# Altium schematic symbol library IC.SchLib: 555 symbols (part 9 of 15)
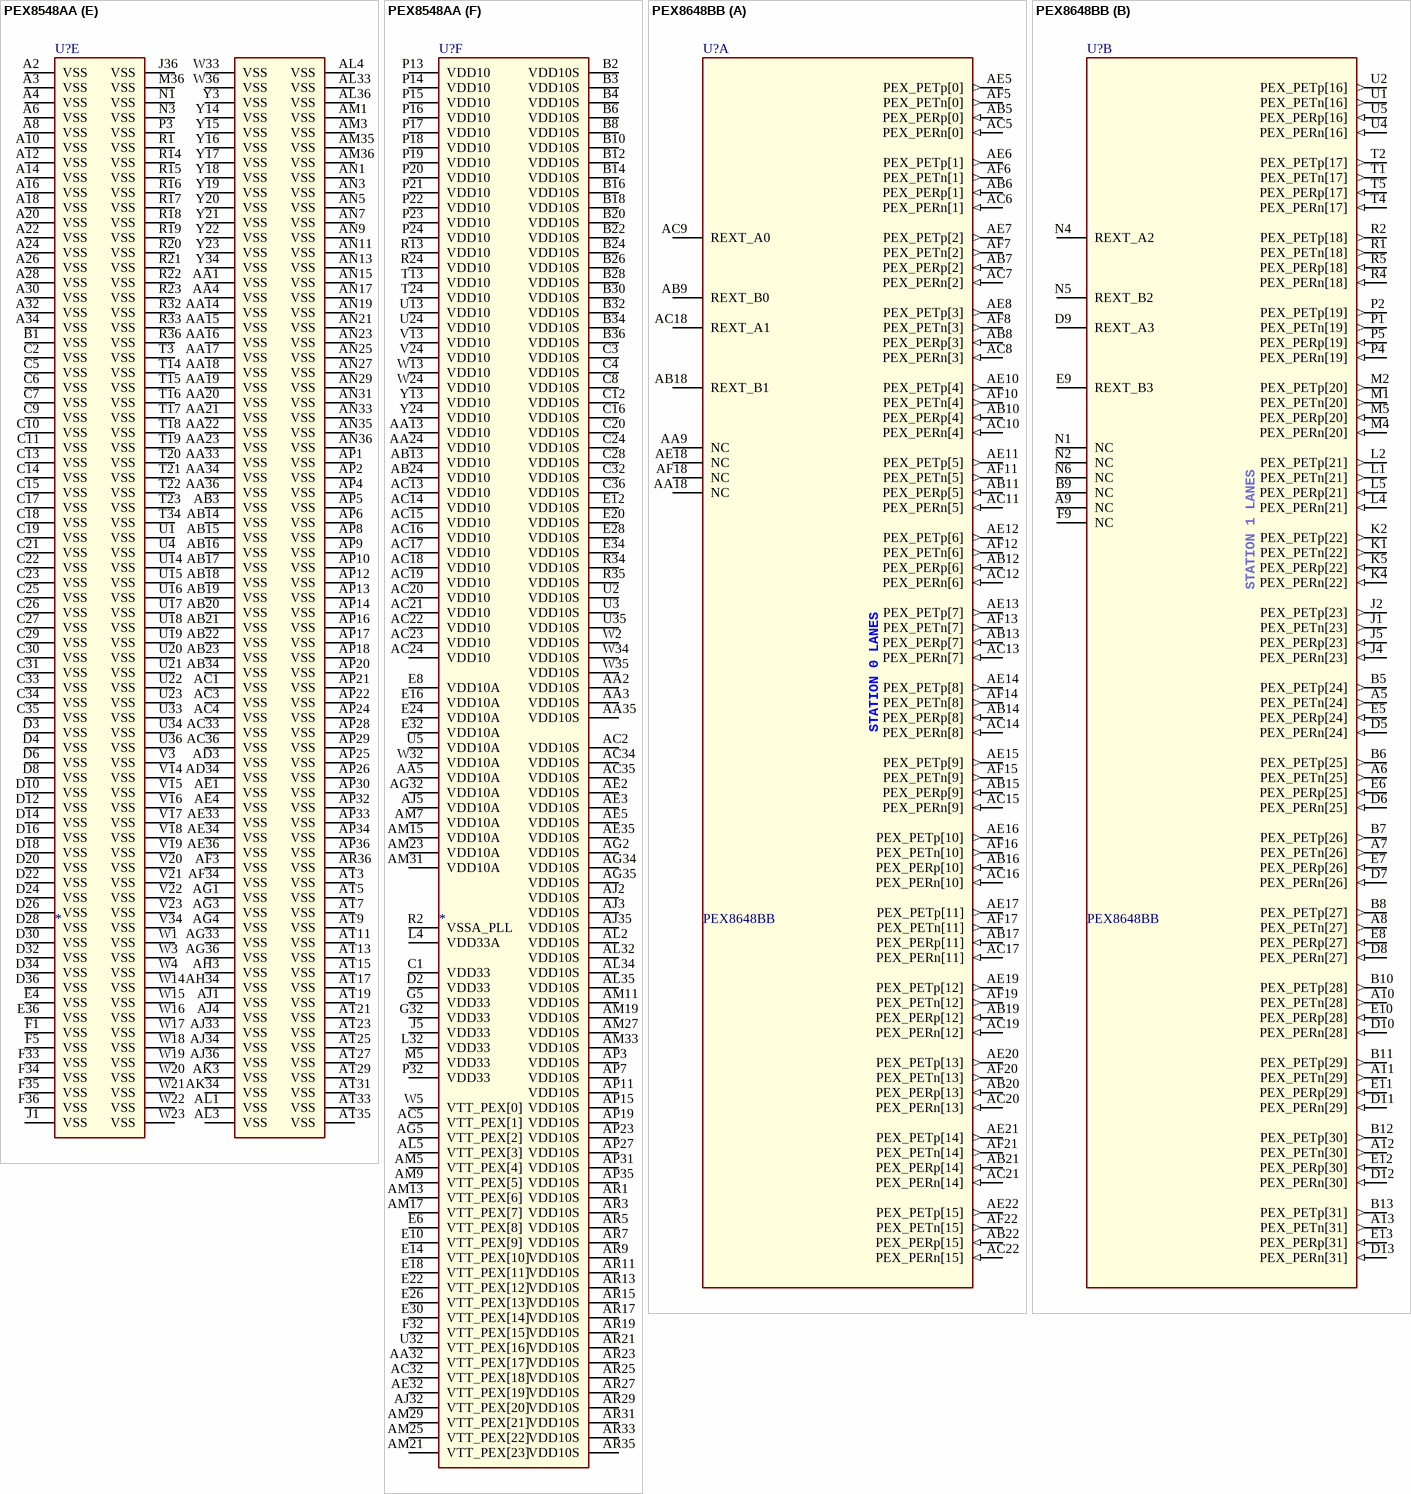
[diagram p78: symbols PEX8548AA to PEX8648BB]

## PEX8548AA
designator U?
Manufacturer: PLX Technology; Manufacturer No: PEX8548AA; Sort: 510; Tech: SMDR; Package: BGA736-H3; Price: 0
footprint BGA736-H3 (PBGA 736pin)
part A pins: AB1 PEX_PETn[2] (out), AB2 PEX_PETp[2] (out), AB4 PEX_PERp[2] (in), AB5 PEX_PERn[2] (in), AD1 PEX_PETn[3] (out), AD2 PEX_PETp[3] (out), AD4 PEX_PERp[3] (in), AD5 PEX_PERn[3] (in), AF1 PEX_PETn[4] (out), AF2 PEX_PETp[4] (out), AF4 PEX_PERp[4] (in), AF5 PEX_PERn[4] (in), AH1 PEX_PETn[5] (out), AH2 PEX_PETp[5] (out), AH4 PEX_PERp[5] (in), AH5 PEX_PERn[5] (in), AK1 PEX_PETn[6] (out), AK2 PEX_PETp[6] (out), AK4 PEX_PERp[6] (in), AK5 PEX_PERn[6] (in), AM2 PEX_PERn[7] (in), AM4 PEX_PERn[8] (in), AM6 PEX_PERn[9] (in), AM8 PEX_PERn[10] (in), AM10 PEX_PERn[11] (in), AM12 PEX_PERn[12] (in), AM14 PEX_PERn[13] (in), AM16 PEX_PERn[14] (in), AM18 PEX_PERn[15] (in), AN2 PEX_PERp[7] (in), AN4 PEX_PERp[8] (in), AN6 PEX_PERp[9] (in), AN8 PEX_PERp[10] (in), AN10 PEX_PERp[11] (in), AN12 PEX_PERp[12] (in), AN14 PEX_PERp[13] (in), AN16 PEX_PERp[14] (in), AN18 PEX_PERp[15] (in), AR2 PEX_PETp[7] (out), AR4 PEX_PETp[8] (out), AR6 PEX_PETp[9] (out), AR8 PEX_PETp[10] (out), AR10 PEX_PETp[11] (out), AR12 PEX_PETp[12] (out), AR14 PEX_PETp[13] (out), AR16 PEX_PETp[14] (out), AR18 PEX_PETp[15] (out), AT2 PEX_PETn[7] (out), AT4 PEX_PETn[8] (out), AT6 PEX_PETn[9] (out), AT8 PEX_PETn[10] (out), AT10 PEX_PETn[11] (out), AT12 PEX_PETn[12] (out), AT14 PEX_PETn[13] (out), AT16 PEX_PETn[14] (out), AT18 PEX_PETn[15] (out), D1 HP_BUTTON[1]# (in), H2 HP_MRL[1]# (in), H3 HP_ATNLED[1]# (out), J4 HP_PWRFLT[1]# (in), K1 HP_PRSNT[1]# (in), K2 HP_PWREN[1]# (out), K5 HP_PERST[1]# (out), M3 HP_CLKEN[1]# (out), M33 PEX_PORT_GOOD[2] (out), M35 PEX_PORT_GOOD[1] (out), N5 PEX_PORT_GOOD[0] (out), P4 HP_PWRLED[1]# (out), V1 PEX_PETn[0] (out), V2 PEX_PETp[0] (out), V4 PEX_PERp[0] (in), V5 PEX_PERn[0] (in), Y1 PEX_PETn[1] (out), Y2 PEX_PETp[1] (out), Y4 PEX_PERp[1] (in), Y5 PEX_PERn[1] (in)
part B pins: A5 PEX_PETn[16] (out), A7 PEX_PETn[17] (out), A9 PEX_PETn[18] (out), A11 PEX_PETn[19] (out), A13 PEX_PETn[20] (out), A15 PEX_PETn[21] (out), A17 PEX_PETn[22] (out), A19 PEX_PETn[23] (out), A21 PEX_PETn[24] (out), A23 PEX_PETn[25] (out), A25 PEX_PETn[26] (out), A27 PEX_PETn[27] (out), A29 PEX_PETn[28] (out), A31 PEX_PETn[29] (out), A33 PEX_PETn[30] (out), A35 PEX_PETn[31] (out), B5 PEX_PETp[16] (out), B7 PEX_PETp[17] (out), B9 PEX_PETp[18] (out), B11 PEX_PETp[19] (out), B13 PEX_PETp[20] (out), B15 PEX_PETp[21] (out), B17 PEX_PETp[22] (out), B19 PEX_PETp[23] (out), B21 PEX_PETp[24] (out), B23 PEX_PETp[25] (out), B25 PEX_PETp[26] (out), B27 PEX_PETp[27] (out), B29 PEX_PETp[28] (out), B31 PEX_PETp[29] (out), B33 PEX_PETp[30] (out), B35 PEX_PETp[31] (out), D5 PEX_PERp[16] (in), D7 PEX_PERp[17] (in), D9 PEX_PERp[18] (in), D11 PEX_PERp[19] (in), D13 PEX_PERp[20] (in), D15 PEX_PERp[21] (in), D17 PEX_PERp[22] (in), D19 PEX_PERp[23] (in), D21 PEX_PERp[24] (in), D23 PEX_PERp[25] (in), D25 PEX_PERp[26] (in), D27 PEX_PERp[27] (in), D29 PEX_PERp[28] (in), D31 PEX_PERp[29] (in), D33 PEX_PERp[30] (in), D35 PEX_PERp[31] (in), E1 HP_PWRLED[8]# (out), E5 PEX_PERn[16] (in), E7 PEX_PERn[17] (in), E9 PEX_PERn[18] (in), E11 PEX_PERn[19] (in), E13 PEX_PERn[20] (in), E15 PEX_PERn[21] (in), E17 PEX_PERn[22] (in), E19 PEX_PERn[23] (in), E21 PEX_PERn[24] (in), E23 PEX_PERn[25] (in), E25 PEX_PERn[26] (in), E27 PEX_PERn[27] (in), E29 PEX_PERn[28] (in), E31 PEX_PERn[29] (in), E33 PEX_PERn[30] (in), E35 PEX_PERn[31] (in), G3 HP_CLKEN[8]# (out), J2 HP_PRSNT[8]# (in), J3 HP_PERST[8]# (out), K4 HP_PWRLED[9]# (out), K32 PEX_PORT_GOOD[9] (out), L1 HP_CLKEN[9]# (out), L2 HP_ATNLED[8]# (out), L3 HP_PWRFLT[8]# (in), M1 HP_PWREN[9]# (out), M2 HP_PRSNT[9]# (in), M4 HP_PWREN[8]# (out), M32 PEX_PORT_GOOD[10] (out), N2 HP_ATNLED[9]# (out), N4 HP_MRL[8]# (in), P2 HP_MRL[9]# (in), P5 HP_BUTTON[8]# (in), R4 HP_PERST[9]# (out), R5 HP_PWRFLT[9]# (in), T4 HP_BUTTON[9]# (in), T5 PEX_PORT_GOOD[8] (out)
part C pins: AB32 PEX_PERn[35] (in), AB33 PEX_PERp[35] (in), AB35 PEX_PETp[35] (out), AB36 PEX_PETn[35] (out), AD32 PEX_PERn[36] (in), AD33 PEX_PERp[36] (in), AD35 PEX_PETp[36] (out), AD36 PEX_PETn[36] (out), AF32 PEX_PERn[37] (in), AF33 PEX_PERp[37] (in), AF35 PEX_PETp[37] (out), AF36 PEX_PETn[37] (out), AH32 PEX_PERn[38] (in), AH33 PEX_PERp[38] (in), AH35 PEX_PETp[38] (out), AH36 PEX_PETn[38] (out), AK32 PEX_PERn[39] (in), AK33 PEX_PERp[39] (in), AK35 PEX_PETp[39] (out), AK36 PEX_PETn[39] (out), AM20 PEX_PERn[47] (in), AM22 PEX_PERn[46] (in), AM24 PEX_PERn[45] (in), AM26 PEX_PERn[44] (in), AM28 PEX_PERn[43] (in), AM30 PEX_PERn[42] (in), AM32 PEX_PERn[41] (in), AM34 PEX_PERn[40] (in), AN20 PEX_PERp[47] (in), AN22 PEX_PERp[46] (in), AN24 PEX_PERp[45] (in), AN26 PEX_PERp[44] (in), AN28 PEX_PERp[43] (in), AN30 PEX_PERp[42] (in), AN32 PEX_PERp[41] (in), AN34 PEX_PERp[40] (in), AR20 PEX_PETp[47] (out), AR22 PEX_PETp[46] (out), AR24 PEX_PETp[45] (out), AR26 PEX_PETp[44] (out), AR28 PEX_PETp[43] (out), AR30 PEX_PETp[42] (out), AR32 PEX_PETp[41] (out), AR34 PEX_PETp[40] (out), AT20 PEX_PETn[47] (out), AT22 PEX_PETn[46] (out), AT24 PEX_PETn[45] (out), AT26 PEX_PETn[44] (out), AT28 PEX_PETn[43] (out), AT30 PEX_PETn[42] (out), AT32 PEX_PETn[41] (out), AT34 PEX_PETn[40] (out), L33 PEX_PORT_GOOD[14] (out), L35 PEX_PORT_GOOD[13] (out), L36 PEX_PORT_GOOD[12] (out), T32 PEX_PERn[32] (in), T33 PEX_PERp[32] (in), T35 PEX_PETp[32] (out), T36 PEX_PETn[32] (out), V32 PEX_PERn[33] (in), V33 PEX_PERp[33] (in), V35 PEX_PETp[33] (out), V36 PEX_PETn[33] (out), Y32 PEX_PERn[34] (in), Y33 PEX_PERp[34] (in), Y35 PEX_PETp[34] (out), Y36 PEX_PETn[34] (out)
part D pins: E2 THERMAL_DIODEn, E3 JTAG_TCK (in), F2 JTAG_TDI (in), F3 JTAG_TRST# (in), F4 JTAG_TMS (in), G1 STRAP_UPSTRM_PORTSEL[0] (in), G2 STRAP_UPSTRM_PORTSEL[2] (in), G4 JTAG_TDO (out), G33 STRAP_TESTMODE[0] (in), G34 STRAP_TESTMODE[1] (in), G35 NC, G36 I2C_INTA_ENABLE# (in), H1 STRAP_UPSTRM_PORTSEL[3] (in), H4 THERMAL_DIODEp, H5 PEX_PERST# (in), H32 STRAP_TESTMODE[3] (in), H33 STRAP_PROBE_MODE# (in), H34 STRAP_DEBUG_SEL[1] (in), H35 STRAP_TESTMODE[2] (in), H36 I2C_SDA (io), J32 STRAP_DEBUG_SEL[0] (in), J33 STRAP_STN1_PORTCFG[0] (in), J34 I2C_SCL (in), J35 STRAP_STN1_PORTCFG[1] (in), K3 STRAP_UPSTRM_PORTSEL[1] (in), K33 I2C_ADDR[1] (in), K34 I2C_ADDR[2] (in), K35 STRAP_STN2_PORTCFG[1] (in), K36 I2C_ADDR[0] (in), L5 STRAP_PLL_BYPASS# (in), L34 STRAP_STN2_PORTCFG[0] (in), M34 NC, N32 FATAL_ERR# (out), N33 PEX_INTA# (out), N34 STRAP_STN0_PORTCFG[0] (in), N35 STRAP_STN0_PORTCFG[1] (in), N36 EE_SK (out), P1 NC_PROCMON (out), P33 EE_DO (in), P34 EE_DI (out), P35 EE_CS# (out), P36 STRAP_SERDES_MODE_ENABLE# (in), R3 STRAP_FAST_BRINGUP# (in), T1 PEX_REFCLKn (in), T2 PEX_REFCLKp (in)
part E pins: A2 VSS (power), A3 VSS (power), A4 VSS (power), A6 VSS (power), A8 VSS (power), A10 VSS (power), A12 VSS (power), A14 VSS (power), A16 VSS (power), A18 VSS (power), A20 VSS (power), A22 VSS (power), A24 VSS (power), A26 VSS (power), A28 VSS (power), A30 VSS (power), A32 VSS (power), A34 VSS (power), AA1 VSS (power), AA4 VSS (power), AA14 VSS (power), AA15 VSS (power), AA16 VSS (power), AA17 VSS (power), AA18 VSS (power), AA19 VSS (power), AA20 VSS (power), AA21 VSS (power), AA22 VSS (power), AA23 VSS (power), AA33 VSS (power), AA34 VSS (power), AA36 VSS (power), AB3 VSS (power), AB14 VSS (power), AB15 VSS (power), AB16 VSS (power), AB17 VSS (power), AB18 VSS (power), AB19 VSS (power), AB20 VSS (power), AB21 VSS (power), AB22 VSS (power), AB23 VSS (power), AB34 VSS (power), AC1 VSS (power), AC3 VSS (power), AC4 VSS (power), AC33 VSS (power), AC36 VSS (power), AD3 VSS (power), AD34 VSS (power), AE1 VSS (power), AE4 VSS (power), AE33 VSS (power), AE34 VSS (power), AE36 VSS (power), AF3 VSS (power), AF34 VSS (power), AG1 VSS (power), AG3 VSS (power), AG4 VSS (power), AG33 VSS (power), AG36 VSS (power), AH3 VSS (power), AH34 VSS (power), AJ1 VSS (power), AJ4 VSS (power), AJ33 VSS (power), AJ34 VSS (power), AJ36 VSS (power), AK3 VSS (power), AK34 VSS (power), AL1 VSS (power), AL3 VSS (power), AL4 VSS (power), AL33 VSS (power), AL36 VSS (power), AM1 VSS (power), AM3 VSS (power), AM35 VSS (power), AM36 VSS (power), AN1 VSS (power), AN3 VSS (power), AN5 VSS (power), AN7 VSS (power), AN9 VSS (power), AN11 VSS (power), AN13 VSS (power), AN15 VSS (power), AN17 VSS (power), AN19 VSS (power), AN21 VSS (power), AN23 VSS (power), AN25 VSS (power), AN27 VSS (power), AN29 VSS (power), AN31 VSS (power), AN33 VSS (power), AN35 VSS (power), AN36 VSS (power), AP1 VSS (power), AP2 VSS (power), AP4 VSS (power), AP5 VSS (power), AP6 VSS (power), AP8 VSS (power), AP9 VSS (power), AP10 VSS (power), AP12 VSS (power), AP13 VSS (power), AP14 VSS (power), AP16 VSS (power), AP17 VSS (power), AP18 VSS (power), AP20 VSS (power), AP21 VSS (power), AP22 VSS (power), AP24 VSS (power), AP25 VSS (power), AP26 VSS (power), AP28 VSS (power), AP29 VSS (power), AP30 VSS (power), AP32 VSS (power), AP33 VSS (power), AP34 VSS (power), AP36 VSS (power), AR36 VSS (power), AT3 VSS (power), AT5 VSS (power), AT7 VSS (power), AT9 VSS (power), AT11 VSS (power), AT13 VSS (power), AT15 VSS (power), AT17 VSS (power), AT19 VSS (power), AT21 VSS (power), AT23 VSS (power), AT25 VSS (power), AT27 VSS (power), AT29 VSS (power), AT31 VSS (power), AT33 VSS (power), AT35 VSS (power), B1 VSS (power), C2 VSS (power), C5 VSS (power), C6 VSS (power), C7 VSS (power), C9 VSS (power), C10 VSS (power), C11 VSS (power), C13 VSS (power), C14 VSS (power), C15 VSS (power), C17 VSS (power), C18 VSS (power), C19 VSS (power), C21 VSS (power), C22 VSS (power), C23 VSS (power), C25 VSS (power), C26 VSS (power), C27 VSS (power), C29 VSS (power), C30 VSS (power), C31 VSS (power), C33 VSS (power), C34 VSS (power), C35 VSS (power), D3 VSS (power), D4 VSS (power), D6 VSS (power), D8 VSS (power), D10 VSS (power), D12 VSS (power), D14 VSS (power), D16 VSS (power), D18 VSS (power), D20 VSS (power), D22 VSS (power), D24 VSS (power), D26 VSS (power), D28 VSS (power), D30 VSS (power), D32 VSS (power), D34 VSS (power), D36 VSS (power), E4 VSS (power), E36 VSS (power), F1 VSS (power), F5 VSS (power), F33 VSS (power), F34 VSS (power), F35 VSS (power), F36 VSS (power), J1 VSS (power), J36 VSS (power), M36 VSS (power), N1 VSS (power), N3 VSS (power), P3 VSS (power), R1 VSS (power), R14 VSS (power), R15 VSS (power), R16 VSS (power), R17 VSS (power), R18 VSS (power), R19 VSS (power), R20 VSS (power), R21 VSS (power), R22 VSS (power), R23 VSS (power), R32 VSS (power), R33 VSS (power), R36 VSS (power), T3 VSS (power), T14 VSS (power), T15 VSS (power), T16 VSS (power), T17 VSS (power), T18 VSS (power), T19 VSS (power), T20 VSS (power), T21 VSS (power), T22 VSS (power), T23 VSS (power), T34 VSS (power), U1 VSS (power), U4 VSS (power), U14 VSS (power), U15 VSS (power), U16 VSS (power), U17 VSS (power), U18 VSS (power), U19 VSS (power), U20 VSS (power), U21 VSS (power), U22 VSS (power), U23 VSS (power), U33 VSS (power), U34 VSS (power), U36 VSS (power), V3 VSS (power), V14 VSS (power), V15 VSS (power), V16 VSS (power), V17 VSS (power), V18 VSS (power), V19 VSS (power), V20 VSS (power), V21 VSS (power), V22 VSS (power), V23 VSS (power), V34 VSS (power), W1 VSS (power), W3 VSS (power), W4 VSS (power), W14 VSS (power), W15 VSS (power), W16 VSS (power), W17 VSS (power), W18 VSS (power), W19 VSS (power), W20 VSS (power), W21 VSS (power), W22 VSS (power), W23 VSS (power), W33 VSS (power), W36 VSS (power), Y3 VSS (power), Y14 VSS (power), Y15 VSS (power), Y16 VSS (power), Y17 VSS (power), Y18 VSS (power), Y19 VSS (power), Y20 VSS (power), Y21 VSS (power), Y22 VSS (power), Y23 VSS (power), Y34 VSS (power)
part F pins: AA2 VDD10S (power), AA3 VDD10S (power), AA5 VDD10A (power), AA13 VDD10 (power), AA24 VDD10 (power), AA32 VTT_PEX[17] (power), AA35 VDD10S (power), AB13 VDD10 (power), AB24 VDD10 (power), AC2 VDD10S (power), AC5 VTT_PEX[1] (power), AC13 VDD10 (power), AC14 VDD10 (power), AC15 VDD10 (power), AC16 VDD10 (power), AC17 VDD10 (power), AC18 VDD10 (power), AC19 VDD10 (power), AC20 VDD10 (power), AC21 VDD10 (power), AC22 VDD10 (power), AC23 VDD10 (power), AC24 VDD10 (power), AC32 VTT_PEX[18] (power), AC34 VDD10S (power), AC35 VDD10S (power), AE2 VDD10S (power), AE3 VDD10S (power), AE5 VDD10S (power), AE32 VTT_PEX[19] (power), AE35 VDD10S (power), AG2 VDD10S (power), AG5 VTT_PEX[2] (power), AG32 VDD10A (power), AG34 VDD10S (power), AG35 VDD10S (power), AJ2 VDD10S (power), AJ3 VDD10S (power), AJ5 VDD10A (power), AJ32 VTT_PEX[20] (power), AJ35 VDD10S (power), AL2 VDD10S (power), AL5 VTT_PEX[3] (power), AL32 VDD10S (power), AL34 VDD10S (power), AL35 VDD10S (power), AM5 VTT_PEX[4] (power), AM7 VDD10A (power), AM9 VTT_PEX[5] (power), AM11 VDD10S (power), AM13 VTT_PEX[6] (power), AM15 VDD10A (power), AM17 VTT_PEX[7] (power), AM19 VDD10S (power), AM21 VTT_PEX[23] (power), AM23 VDD10A (power), AM25 VTT_PEX[22] (power), AM27 VDD10S (power), AM29 VTT_PEX[21] (power), AM31 VDD10A (power), AM33 VDD10S (power), AP3 VDD10S (power), AP7 VDD10S (power), AP11 VDD10S (power), AP15 VDD10S (power), AP19 VDD10S (power), AP23 VDD10S (power), AP27 VDD10S (power), AP31 VDD10S (power), AP35 VDD10S (power), AR1 VDD10S (power), AR3 VDD10S (power), AR5 VDD10S (power), AR7 VDD10S (power), AR9 VDD10S (power), AR11 VDD10S (power), AR13 VDD10S (power), AR15 VDD10S (power), AR17 VDD10S (power), AR19 VDD10S (power), AR21 VDD10S (power), AR23 VDD10S (power), AR25 VDD10S (power), AR27 VDD10S (power), AR29 VDD10S (power), AR31 VDD10S (power), AR33 VDD10S (power), AR35 VDD10S (power), B2 VDD10S (power), B3 VDD10S (power), B4 VDD10S (power), B6 VDD10S (power), B8 VDD10S (power), B10 VDD10S (power), B12 VDD10S (power), B14 VDD10S (power), B16 VDD10S (power), B18 VDD10S (power), B20 VDD10S (power), B22 VDD10S (power), B24 VDD10S (power), B26 VDD10S (power), B28 VDD10S (power), B30 VDD10S (power), B32 VDD10S (power), B34 VDD10S (power), B36 VDD10S (power), C1 VDD33 (power), C3 VDD10S (power), C4 VDD10S (power), C8 VDD10S (power), C12 VDD10S (power), C16 VDD10S (power), C20 VDD10S (power), C24 VDD10S (power), C28 VDD10S (power), C32 VDD10S (power), C36 VDD10S (power), D2 VDD33 (power), E6 VTT_PEX[8] (power), E8 VDD10A (power), E10 VTT_PEX[9] (power), E12 VDD10S (power), E14 VTT_PEX[10] (power), E16 VDD10A (power), E18 VTT_PEX[11] (power), E20 VDD10S (power), E22 VTT_PEX[12] (power), E24 VDD10A (power), E26 VTT_PEX[13] (power), E28 VDD10S (power), E30 VTT_PEX[14] (power), E32 VDD10A (power), E34 VDD10S (power), F32 VTT_PEX[15] (power), G5 VDD33 (power), G32 VDD33 (power), J5 VDD33 (power), L4 VDD33A (power), L32 VDD33 (power), M5 VDD33 (power), P13 VDD10 (power), P14 VDD10 (power), P15 VDD10 (power), P16 VDD10 (power), P17 VDD10 (power), P18 VDD10 (power), P19 VDD10 (power), P20 VDD10 (power), P21 VDD10 (power), P22 VDD10 (power), P23 VDD10 (power), P24 VDD10 (power), P32 VDD33 (power), R2 VSSA_PLL (power), R13 VDD10 (power), R24 VDD10 (power), R34 VDD10S (power), R35 VDD10S (power), T13 VDD10 (power), T24 VDD10 (power), U2 VDD10S (power), U3 VDD10S (power), U5 VDD10A (power), U13 VDD10 (power), U24 VDD10 (power), U32 VTT_PEX[16] (power), U35 VDD10S (power), V13 VDD10 (power), V24 VDD10 (power), W2 VDD10S (power), W5 VTT_PEX[0] (power), W13 VDD10 (power), W24 VDD10 (power), W32 VDD10A (power), W34 VDD10S (power), W35 VDD10S (power), Y13 VDD10 (power), Y24 VDD10 (power)
part A text: PORT 1; HOTPLUG; STATION 0; PORT STATUS; STATION 0 LANES
part B text: PORT 8; HOTPLUG; PORT 9; STATION 1 LANES; STATION 1; PORT STATUS
part C text: STATION 2 LANES; STATION 2; PORT STATUS
part D text: PCIe INTERFACE; JTAG INTERFACE; I2C INTERFACE; MONITORS; EEPROM INTERFACE; UPSTREAM PORT SELECTION; PORT CONFIGURATION; OPERATIONAL CONFIGURATION; TEST MODE SELECTION

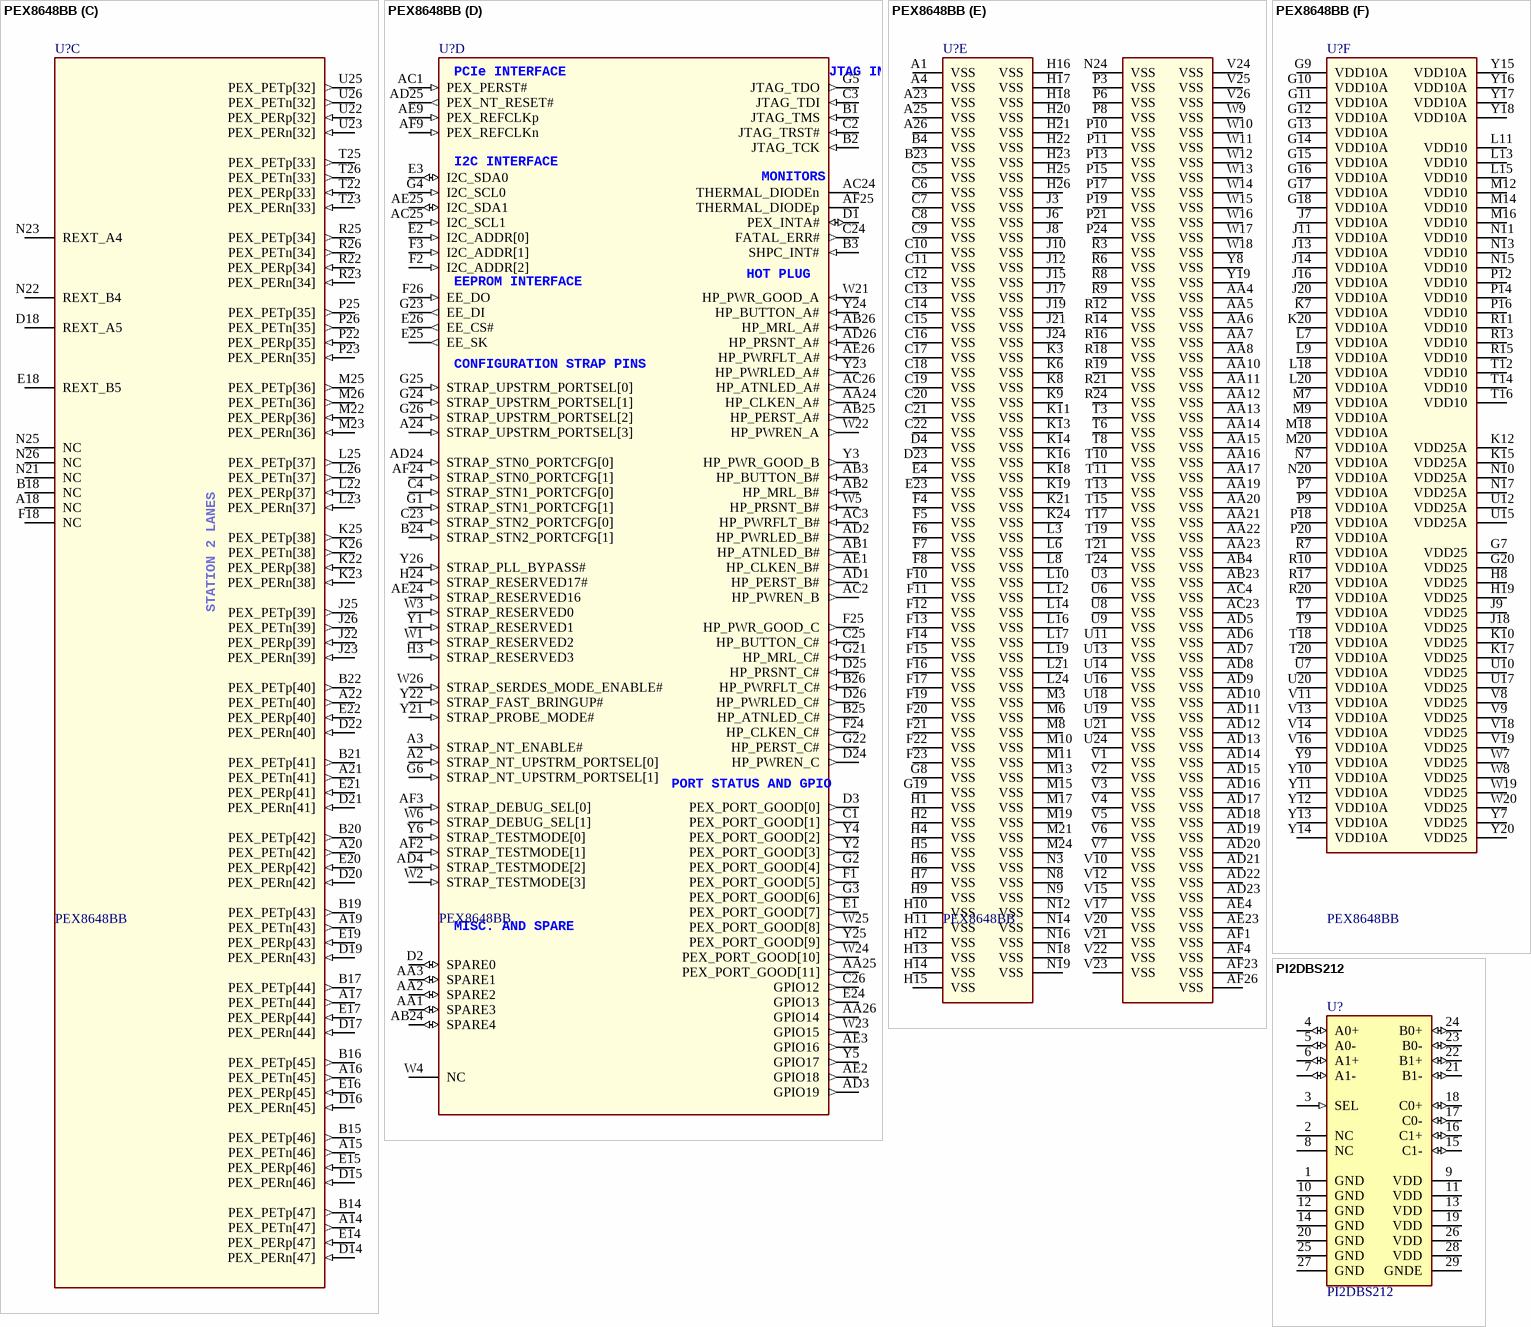
[diagram p37: symbols PEX8648BB to PI2DBS212]

## PEX8648BB
designator U?
Manufacturer: PLX Technology; Manufacturer No: PEX8648-BB50BC F; Sort: 510; Tech: SMDR; Package: FCBGA-676 WITH HEAT SPREADER; Price: 0
footprint FCBGA676 (BGA, 676ball, Body 27x27mm, Pitch 1mm)
part A pins: AA9 NC, AA18 NC, AB5 PEX_PERp[0] (in), AB6 PEX_PERp[1] (in), AB7 PEX_PERp[2] (in), AB8 PEX_PERp[3] (in), AB9 REXT_B0, AB10 PEX_PERp[4] (in), AB11 PEX_PERp[5] (in), AB12 PEX_PERp[6] (in), AB13 PEX_PERp[7] (in), AB14 PEX_PERp[8] (in), AB15 PEX_PERp[9] (in), AB16 PEX_PERp[10] (in), AB17 PEX_PERp[11] (in), AB18 REXT_B1, AB19 PEX_PERp[12] (in), AB20 PEX_PERp[13] (in), AB21 PEX_PERp[14] (in), AB22 PEX_PERp[15] (in), AC5 PEX_PERn[0] (in), AC6 PEX_PERn[1] (in), AC7 PEX_PERn[2] (in), AC8 PEX_PERn[3] (in), AC9 REXT_A0, AC10 PEX_PERn[4] (in), AC11 PEX_PERn[5] (in), AC12 PEX_PERn[6] (in), AC13 PEX_PERn[7] (in), AC14 PEX_PERn[8] (in), AC15 PEX_PERn[9] (in), AC16 PEX_PERn[10] (in), AC17 PEX_PERn[11] (in), AC18 REXT_A1, AC19 PEX_PERn[12] (in), AC20 PEX_PERn[13] (in), AC21 PEX_PERn[14] (in), AC22 PEX_PERn[15] (in), AE5 PEX_PETp[0] (out), AE6 PEX_PETp[1] (out), AE7 PEX_PETp[2] (out), AE8 PEX_PETp[3] (out), AE10 PEX_PETp[4] (out), AE11 PEX_PETp[5] (out), AE12 PEX_PETp[6] (out), AE13 PEX_PETp[7] (out), AE14 PEX_PETp[8] (out), AE15 PEX_PETp[9] (out), AE16 PEX_PETp[10] (out), AE17 PEX_PETp[11] (out), AE18 NC, AE19 PEX_PETp[12] (out), AE20 PEX_PETp[13] (out), AE21 PEX_PETp[14] (out), AE22 PEX_PETp[15] (out), AF5 PEX_PETn[0] (out), AF6 PEX_PETn[1] (out), AF7 PEX_PETn[2] (out), AF8 PEX_PETn[3] (out), AF10 PEX_PETn[4] (out), AF11 PEX_PETn[5] (out), AF12 PEX_PETn[6] (out), AF13 PEX_PETn[7] (out), AF14 PEX_PETn[8] (out), AF15 PEX_PETn[9] (out), AF16 PEX_PETn[10] (out), AF17 PEX_PETn[11] (out), AF18 NC, AF19 PEX_PETn[12] (out), AF20 PEX_PETn[13] (out), AF21 PEX_PETn[14] (out), AF22 PEX_PETn[15] (out)
part B pins: A5 PEX_PETn[24] (out), A6 PEX_PETn[25] (out), A7 PEX_PETn[26] (out), A8 PEX_PETn[27] (out), A9 NC, A10 PEX_PETn[28] (out), A11 PEX_PETn[29] (out), A12 PEX_PETn[30] (out), A13 PEX_PETn[31] (out), B5 PEX_PETp[24] (out), B6 PEX_PETp[25] (out), B7 PEX_PETp[26] (out), B8 PEX_PETp[27] (out), B9 NC, B10 PEX_PETp[28] (out), B11 PEX_PETp[29] (out), B12 PEX_PETp[30] (out), B13 PEX_PETp[31] (out), D5 PEX_PERn[24] (in), D6 PEX_PERn[25] (in), D7 PEX_PERn[26] (in), D8 PEX_PERn[27] (in), D9 REXT_A3, D10 PEX_PERn[28] (in), D11 PEX_PERn[29] (in), D12 PEX_PERn[30] (in), D13 PEX_PERn[31] (in), E5 PEX_PERp[24] (in), E6 PEX_PERp[25] (in), E7 PEX_PERp[26] (in), E8 PEX_PERp[27] (in), E9 REXT_B3, E10 PEX_PERp[28] (in), E11 PEX_PERp[29] (in), E12 PEX_PERp[30] (in), E13 PEX_PERp[31] (in), F9 NC, J1 PEX_PETn[23] (out), J2 PEX_PETp[23] (out), J4 PEX_PERn[23] (in), J5 PEX_PERp[23] (in), K1 PEX_PETn[22] (out), K2 PEX_PETp[22] (out), K4 PEX_PERn[22] (in), K5 PEX_PERp[22] (in), L1 PEX_PETn[21] (out), L2 PEX_PETp[21] (out), L4 PEX_PERn[21] (in), L5 PEX_PERp[21] (in), M1 PEX_PETn[20] (out), M2 PEX_PETp[20] (out), M4 PEX_PERn[20] (in), M5 PEX_PERp[20] (in), N1 NC, N2 NC, N4 REXT_A2, N5 REXT_B2, N6 NC, P1 PEX_PETn[19] (out), P2 PEX_PETp[19] (out), P4 PEX_PERn[19] (in), P5 PEX_PERp[19] (in), R1 PEX_PETn[18] (out), R2 PEX_PETp[18] (out), R4 PEX_PERn[18] (in), R5 PEX_PERp[18] (in), T1 PEX_PETn[17] (out), T2 PEX_PETp[17] (out), T4 PEX_PERn[17] (in), T5 PEX_PERp[17] (in), U1 PEX_PETn[16] (out), U2 PEX_PETp[16] (out), U4 PEX_PERn[16] (in), U5 PEX_PERp[16] (in)
part C pins: A14 PEX_PETn[47] (out), A15 PEX_PETn[46] (out), A16 PEX_PETn[45] (out), A17 PEX_PETn[44] (out), A18 NC, A19 PEX_PETn[43] (out), A20 PEX_PETn[42] (out), A21 PEX_PETn[41] (out), A22 PEX_PETn[40] (out), B14 PEX_PETp[47] (out), B15 PEX_PETp[46] (out), B16 PEX_PETp[45] (out), B17 PEX_PETp[44] (out), B18 NC, B19 PEX_PETp[43] (out), B20 PEX_PETp[42] (out), B21 PEX_PETp[41] (out), B22 PEX_PETp[40] (out), D14 PEX_PERn[47] (in), D15 PEX_PERn[46] (in), D16 PEX_PERn[45] (in), D17 PEX_PERn[44] (in), D18 REXT_A5, D19 PEX_PERn[43] (in), D20 PEX_PERn[42] (in), D21 PEX_PERn[41] (in), D22 PEX_PERn[40] (in), E14 PEX_PERp[47] (in), E15 PEX_PERp[46] (in), E16 PEX_PERp[45] (in), E17 PEX_PERp[44] (in), E18 REXT_B5, E19 PEX_PERp[43] (in), E20 PEX_PERp[42] (in), E21 PEX_PERp[41] (in), E22 PEX_PERp[40] (in), F18 NC, J22 PEX_PERp[39] (in), J23 PEX_PERn[39] (in), J25 PEX_PETp[39] (out), J26 PEX_PETn[39] (out), K22 PEX_PERp[38] (in), K23 PEX_PERn[38] (in), K25 PEX_PETp[38] (out), K26 PEX_PETn[38] (out), L22 PEX_PERp[37] (in), L23 PEX_PERn[37] (in), L25 PEX_PETp[37] (out), L26 PEX_PETn[37] (out), M22 PEX_PERp[36] (in), M23 PEX_PERn[36] (in), M25 PEX_PETp[36] (out), M26 PEX_PETn[36] (out), N21 NC, N22 REXT_B4, N23 REXT_A4, N25 NC, N26 NC, P22 PEX_PERp[35] (in), P23 PEX_PERn[35] (in), P25 PEX_PETp[35] (out), P26 PEX_PETn[35] (out), R22 PEX_PERp[34] (in), R23 PEX_PERn[34] (in), R25 PEX_PETp[34] (out), R26 PEX_PETn[34] (out), T22 PEX_PERp[33] (in), T23 PEX_PERn[33] (in), T25 PEX_PETp[33] (out), T26 PEX_PETn[33] (out), U22 PEX_PERp[32] (in), U23 PEX_PERn[32] (in), U25 PEX_PETp[32] (out), U26 PEX_PETn[32] (out)
part D pins: A2 STRAP_NT_UPSTRM_PORTSEL[0] (in), A3 STRAP_NT_ENABLE# (in), A24 STRAP_UPSTRM_PORTSEL[3] (in), AA1 SPARE3 (io), AA2 SPARE2 (io), AA3 SPARE1 (io), AA24 HP_CLKEN_A# (out), AA25 PEX_PORT_GOOD[11] (out), AA26 GPIO14 (out), AB1 HP_ATNLED_B# (out), AB2 HP_MRL_B# (in), AB3 HP_BUTTON_B# (in), AB24 SPARE4 (io), AB25 HP_PERST_A# (out), AB26 HP_MRL_A# (in), AC1 PEX_PERST# (in), AC2 HP_PWREN_B (out), AC3 HP_PWRFLT_B# (in), AC24 THERMAL_DIODEn, AC25 I2C_SCL1 (in), AC26 HP_ATNLED_A# (out), AD1 HP_PERST_B# (out), AD2 HP_PWRLED_B# (out), AD3 GPIO19 (out), AD4 STRAP_TESTMODE[2] (in), AD24 STRAP_STN0_PORTCFG[0] (in), AD25 PEX_NT_RESET# (out), AD26 HP_PRSNT_A# (in), AE1 HP_CLKEN_B# (out), AE2 GPIO18 (out), AE3 GPIO16 (out), AE9 PEX_REFCLKp (in), AE24 STRAP_RESERVED16 (in), AE25 I2C_SDA1 (io), AE26 HP_PWRFLT_A# (in), AF2 STRAP_TESTMODE[1] (in), AF3 STRAP_DEBUG_SEL[0] (in), AF9 PEX_REFCLKn (in), AF24 STRAP_STN0_PORTCFG[1] (in), AF25 THERMAL_DIODEp, B1 JTAG_TMS (in), B2 JTAG_TCK (in), B3 SHPC_INT# (in), B24 STRAP_STN2_PORTCFG[1] (in), B25 HP_ATNLED_C# (out), B26 HP_PWRFLT_C# (in), C1 PEX_PORT_GOOD[1] (out), C2 JTAG_TRST# (in), C3 JTAG_TDI (in), C4 STRAP_STN1_PORTCFG[0] (in), C23 STRAP_STN2_PORTCFG[0] (in), C24 FATAL_ERR# (out), C25 HP_BUTTON_C# (in), C26 GPIO12 (out), D1 PEX_INTA# (io), D2 SPARE0 (io), D3 PEX_PORT_GOOD[0] (out), D24 HP_PWREN_C (out), D25 HP_PRSNT_C# (in), D26 HP_PWRLED_C# (out), E1 PEX_PORT_GOOD[7] (out), E2 I2C_ADDR[0] (in), E3 I2C_SDA0 (io), E24 GPIO13 (out), E25 EE_SK (out), E26 EE_CS# (out), F1 PEX_PORT_GOOD[5] (out), F2 I2C_ADDR[2] (in), F3 I2C_ADDR[1] (in), F24 HP_CLKEN_C# (out), F25 HP_PWR_GOOD_C (out), F26 EE_DO (in), G1 STRAP_STN1_PORTCFG[1] (in), G2 PEX_PORT_GOOD[4] (out), G3 PEX_PORT_GOOD[6] (out), G4 I2C_SCL0 (in), G5 JTAG_TDO (out), G6 STRAP_NT_UPSTRM_PORTSEL[1] (in), G21 HP_MRL_C# (in), G22 HP_PERST_C# (out), G23 EE_DI (out), G24 STRAP_UPSTRM_PORTSEL[1] (in), G25 STRAP_UPSTRM_PORTSEL[0] (in), G26 STRAP_UPSTRM_PORTSEL[2] (in), H3 STRAP_RESERVED3 (in), H24 STRAP_RESERVED17# (in), W1 STRAP_RESERVED2 (in), W2 STRAP_TESTMODE[3] (in), W3 STRAP_RESERVED0 (in), W4 NC, W5 HP_PRSNT_B# (in), W6 STRAP_DEBUG_SEL[1] (in), W21 HP_PWR_GOOD_A (in), W22 HP_PWREN_A (out), W23 GPIO15 (out), W24 PEX_PORT_GOOD[10] (out), W25 PEX_PORT_GOOD[8] (out), W26 STRAP_SERDES_MODE_ENABLE# (in), Y1 STRAP_RESERVED1 (in), Y2 PEX_PORT_GOOD[3] (out), Y3 HP_PWR_GOOD_B (out), Y4 PEX_PORT_GOOD[2] (out), Y5 GPIO17 (out), Y6 STRAP_TESTMODE[0] (in), Y21 STRAP_PROBE_MODE# (in), Y22 STRAP_FAST_BRINGUP# (in), Y23 HP_PWRLED_A# (out), Y24 HP_BUTTON_A# (in), Y25 PEX_PORT_GOOD[9] (out), Y26 STRAP_PLL_BYPASS# (in)
part E pins: A1 VSS (power), A4 VSS (power), A23 VSS (power), A25 VSS (power), A26 VSS (power), AA4 VSS (power), AA5 VSS (power), AA6 VSS (power), AA7 VSS (power), AA8 VSS (power), AA10 VSS (power), AA11 VSS (power), AA12 VSS (power), AA13 VSS (power), AA14 VSS (power), AA15 VSS (power), AA16 VSS (power), AA17 VSS (power), AA19 VSS (power), AA20 VSS (power), AA21 VSS (power), AA22 VSS (power), AA23 VSS (power), AB4 VSS (power), AB23 VSS (power), AC4 VSS (power), AC23 VSS (power), AD5 VSS (power), AD6 VSS (power), AD7 VSS (power), AD8 VSS (power), AD9 VSS (power), AD10 VSS (power), AD11 VSS (power), AD12 VSS (power), AD13 VSS (power), AD14 VSS (power), AD15 VSS (power), AD16 VSS (power), AD17 VSS (power), AD18 VSS (power), AD19 VSS (power), AD20 VSS (power), AD21 VSS (power), AD22 VSS (power), AD23 VSS (power), AE4 VSS (power), AE23 VSS (power), AF1 VSS (power), AF4 VSS (power), AF23 VSS (power), AF26 VSS (power), B4 VSS (power), B23 VSS (power), C5 VSS (power), C6 VSS (power), C7 VSS (power), C8 VSS (power), C9 VSS (power), C10 VSS (power), C11 VSS (power), C12 VSS (power), C13 VSS (power), C14 VSS (power), C15 VSS (power), C16 VSS (power), C17 VSS (power), C18 VSS (power), C19 VSS (power), C20 VSS (power), C21 VSS (power), C22 VSS (power), D4 VSS (power), D23 VSS (power), E4 VSS (power), E23 VSS (power), F4 VSS (power), F5 VSS (power), F6 VSS (power), F7 VSS (power), F8 VSS (power), F10 VSS (power), F11 VSS (power), F12 VSS (power), F13 VSS (power), F14 VSS (power), F15 VSS (power), F16 VSS (power), F17 VSS (power), F19 VSS (power), F20 VSS (power), F21 VSS (power), F22 VSS (power), F23 VSS (power), G8 VSS (power), G19 VSS (power), H1 VSS (power), H2 VSS (power), H4 VSS (power), H5 VSS (power), H6 VSS (power), H7 VSS (power), H9 VSS (power), H10 VSS (power), H11 VSS (power), H12 VSS (power), H13 VSS (power), H14 VSS (power), H15 VSS (power), H16 VSS (power), H17 VSS (power), H18 VSS (power), H20 VSS (power), H21 VSS (power), H22 VSS (power), H23 VSS (power), H25 VSS (power), H26 VSS (power), J3 VSS (power), J6 VSS (power), J8 VSS (power), J10 VSS (power), J12 VSS (power), J15 VSS (power), J17 VSS (power), J19 VSS (power), J21 VSS (power), J24 VSS (power), K3 VSS (power), K6 VSS (power), K8 VSS (power), K9 VSS (power), K11 VSS (power), K13 VSS (power), K14 VSS (power), K16 VSS (power), K18 VSS (power), K19 VSS (power), K21 VSS (power), K24 VSS (power), L3 VSS (power), L6 VSS (power), L8 VSS (power), L10 VSS (power), L12 VSS (power), L14 VSS (power), L16 VSS (power), L17 VSS (power), L19 VSS (power), L21 VSS (power), L24 VSS (power), M3 VSS (power), M6 VSS (power), M8 VSS (power), M10 VSS (power), M11 VSS (power), M13 VSS (power), M15 VSS (power), M17 VSS (power), M19 VSS (power), M21 VSS (power), M24 VSS (power), N3 VSS (power), N8 VSS (power), N9 VSS (power), N12 VSS (power), N14 VSS (power), N16 VSS (power), N18 VSS (power), N19 VSS (power), N24 VSS (power), P3 VSS (power), P6 VSS (power), P8 VSS (power), P10 VSS (power), P11 VSS (power), P13 VSS (power), P15 VSS (power), P17 VSS (power), P19 VSS (power), P21 VSS (power), P24 VSS (power), R3 VSS (power), R6 VSS (power), R8 VSS (power), R9 VSS (power), R12 VSS (power), R14 VSS (power), R16 VSS (power), R18 VSS (power), R19 VSS (power), R21 VSS (power), R24 VSS (power), T3 VSS (power), T6 VSS (power), T8 VSS (power), T10 VSS (power), T11 VSS (power), T13 VSS (power), T15 VSS (power), T17 VSS (power), T19 VSS (power), T21 VSS (power), T24 VSS (power), U3 VSS (power), U6 VSS (power), U8 VSS (power), U9 VSS (power), U11 VSS (power), U13 VSS (power), U14 VSS (power), U16 VSS (power), U18 VSS (power), U19 VSS (power), U21 VSS (power), U24 VSS (power), V1 VSS (power), V2 VSS (power), V3 VSS (power), V4 VSS (power), V5 VSS (power), V6 VSS (power), V7 VSS (power), V10 VSS (power), V12 VSS (power), V15 VSS (power), V17 VSS (power), V20 VSS (power), V21 VSS (power), V22 VSS (power), V23 VSS (power), V24 VSS (power), V25 VSS (power), V26 VSS (power), W9 VSS (power), W10 VSS (power), W11 VSS (power), W12 VSS (power), W13 VSS (power), W14 VSS (power), W15 VSS (power), W16 VSS (power), W17 VSS (power), W18 VSS (power), Y8 VSS (power), Y19 VSS (power)